# Altium footprint library swatpcblib.PcbLib: 202 footprints (part 5 of 13)
Each footprint in its own frame and in the unit in brackets; x right, y up, seen from the top. Pads: shape width x height; smd on the part's side, far side on the other; paste and mask are expansions set on the pad; w line width, h text height; cw(c..) or ccw(c..) is an arc to the next point about the centre after c.
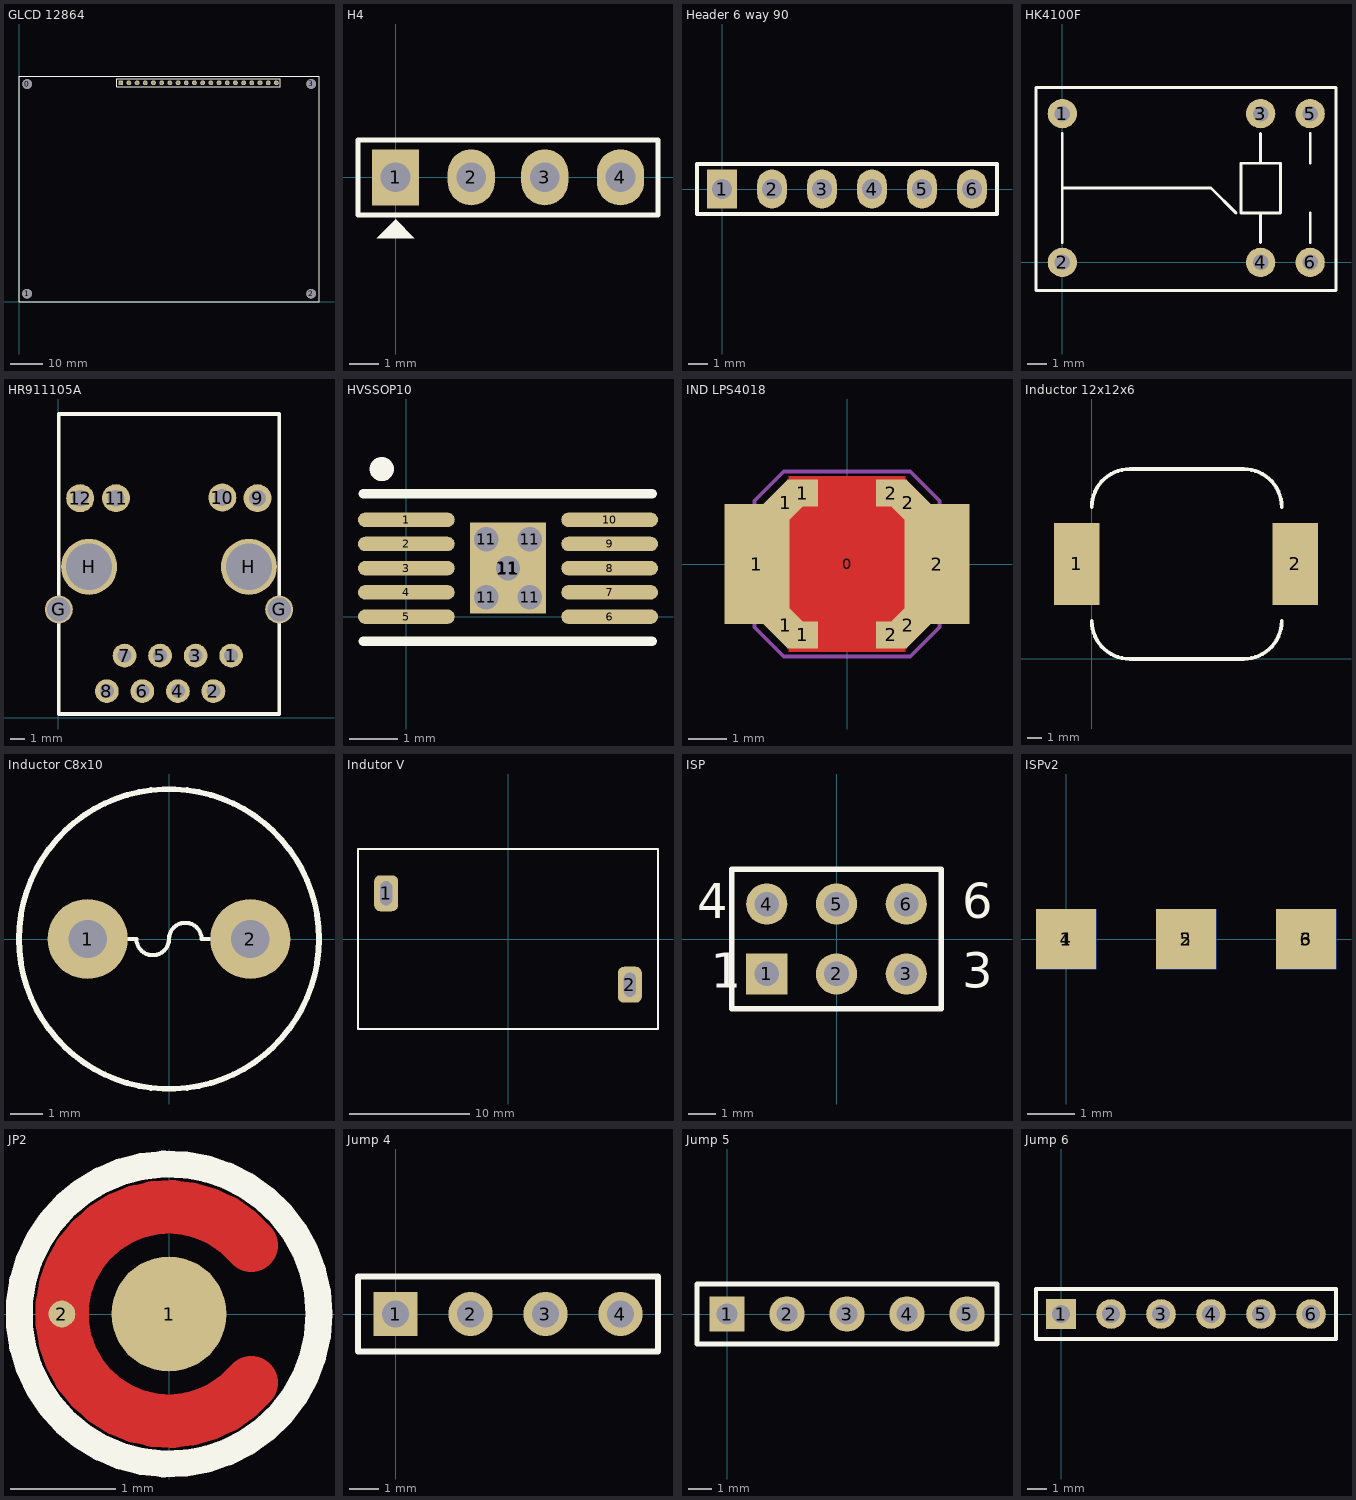
[diagram p4: the footprints below, top view; thin cyan lines are the x and y axes]

## GLCD 12864 [mm]
pads (24):
  round 3 hole 3: 0(2.54,67.488) 1(2.5,2.5) 2(90.551,2.489) 3(90.551,67.513)
  rect 1.5x1.5 hole 0.9: 1(31.521,67.869)
  round 1.5 hole 0.9: 2(34.061,67.869) 3(36.601,67.869) 4(39.141,67.869) 5(41.681,67.869) 6(44.221,67.869) 7(46.761,67.869) 8(49.301,67.869) 9(51.841,67.869) 10(54.381,67.869) 11(56.921,67.869) 12(59.461,67.869) 13(62.001,67.869) 14(64.541,67.869) 15(67.081,67.869) 16(69.621,67.869) 17(72.161,67.869) 18(74.701,67.869) 19(77.241,67.869) 20(79.781,67.869)
Top Overlay:
  lines w0.2: -0.003,-0.043 -0.003,69.957 92.989,69.957 92.989,-0.043 -0.003,-0.043 ; 30.251,66.599 81.051,66.599 81.051,69.139 32.156,69.139 30.251,69.139 30.251,66.599
3D body: height 1.5, standoff 0, extent 78.511,66.599 81.051,69.139
3D body: height 1.5, standoff 0, extent 68.351,66.573 70.891,69.113
3D body: height 1.5, standoff 0, extent 70.891,66.573 73.431,69.113
3D body: height 1.5, standoff 0, extent 73.431,66.573 75.971,69.113
3D body: height 1.5, standoff 0, extent 55.651,66.573 58.191,69.113
3D body: height 1.5, standoff 0, extent 58.191,66.573 60.731,69.113
3D body: height 1.5, standoff 0, extent 60.731,66.573 63.271,69.113
3D body: height 1.5, standoff 0, extent 63.271,66.573 65.811,69.113
3D body: height 1.5, standoff 0, extent 65.811,66.573 68.351,69.113
3D body: height 1.5, standoff 0, extent 42.951,66.573 45.491,69.113
3D body: height 1.5, standoff 0, extent 45.491,66.573 48.031,69.113
3D body: height 1.5, standoff 0, extent 48.031,66.573 50.571,69.113
3D body: height 1.5, standoff 0, extent 50.571,66.573 53.111,69.113
3D body: height 1.5, standoff 0, extent 53.111,66.573 55.651,69.113
3D body: height 1.5, standoff 0, extent 30.251,66.573 32.791,69.113
3D body: height 1.5, standoff 0, extent 32.791,66.573 35.331,69.113
3D body: height 1.5, standoff 0, extent 35.331,66.573 37.871,69.113
3D body: height 1.5, standoff 0, extent 37.871,66.573 40.411,69.113
3D body: height 1.5, standoff 0, extent 40.411,66.573 42.951,69.113
3D body: height 1.5, standoff 0, extent 75.971,66.573 78.511,69.113
3D body "User Library-QC12864B.step": height 9.5, standoff -8, extent 0.058,0.002 93.058,70.002

## H4 [mm]
pads (4):
  rect 1.6x1.9 hole 1: 1(0,0)
  oval 1.6x1.9 hole 1: 2(2.565,0) 3(5.055,0) 4(7.62,0)
Top Overlay:
  region: 0,-1.422 -0.635,-2.057 0.635,-2.057
  lines w0.178: -1.27,-1.27 -1.27,1.27 8.89,1.27 8.89,-1.27 -1.27,-1.27

## Header 6 way 90 [mm]
pads (6):
  rect 1.5x2 hole 1: 1(0,0)
  oval 1.5x2 hole 1: 2(2.54,0) 3(5.08,0) 4(7.62,0) 5(10.16,0) 6(12.7,0)
Top Overlay:
  lines w0.2: -1.27,-1.27 13.97,-1.27 13.97,1.27 -1.27,1.27 -1.27,-1.27
3D body "4234.stp": height 5.88, standoff -3.57, extent -1.117,-8.941 13.869,1.143

## HK4100F [mm] "Relay 6 pin"
pads (6):
  round 1.5 hole 0.8: 1(0,7.62) 2(0,0) 3(10.16,7.62) 4(10.16,0) 5(12.7,7.62) 6(12.7,0)
Top Overlay:
  lines w0.15: 0,1.016 0,6.604 ; 0,3.81 7.62,3.81 8.89,2.54 ; 10.16,1.016 10.16,2.54 ; 10.16,5.08 10.16,6.604 ; 12.7,1.016 12.7,2.54 ; 12.7,5.08 12.7,6.604 ; -1.346,-1.448 14.021,-1.448 14.021,8.966 -1.346,8.966 -1.346,-1.448 ; 9.144,2.54 9.144,5.08 11.176,5.08 11.176,2.54 9.144,2.54
3D body "User Library-HK4100F.step": height 11.82, standoff -2.74, extent -1.379,-1.434 14.021,8.966

## HR911105A [mm] "HanRun HR911105A"
pads (16):
  round 1.7 hole 1: 1(12.369,4.425) 2(11.099,1.885) 3(9.829,4.425) 4(8.559,1.885) 5(7.289,4.425) 6(6.019,1.885) 7(4.749,4.425) 8(3.479,1.885)
  round 2 hole 1.2: 9(14.249,15.675) 10(11.735,15.723) 11(4.139,15.675) 12(1.575,15.672)
  round 2 hole 1.7: G(0.049,7.725) G(15.799,7.725)
  round 4 hole 3.3: H(2.209,10.775) H(13.639,10.775)
Top Overlay:
  lines w0.254: 0.049,0.254 0.049,21.692 15.799,21.692 15.799,0.254 0.049,0.254
3D body "User Library-HR911105A.step": height 13.51, standoff -2.99, extent 0.051,0.292 15.931,21.692

## HVSSOP10 [mm] "TPS92512"
pads (16):
  oval 2x0.3 smd paste-0.102 mask+0.051: 1(0,2) 2(0,1.5) 3(0,1) 4(0,0.5) 5(0,0) 6(4.2,0) 7(4.2,0.5) 8(4.2,1) 9(4.2,1.5) 10(4.2,2)
  round 0.5 hole 0.5 mask+0.051: 11(1.65,0.4) 11(1.65,1.6) 11(2.1,1) 11(2.55,0.4) 11(2.55,1.6)
  rect 1.57x1.88 smd paste-0.102 mask+0.051: 11(2.1,1)
Top Overlay:
  circle w0.25: c-0.508,3.048 r0.125
  lines w0.2: -0.889,-0.508 5.08,-0.508 ; -0.889,2.54 5.08,2.54
3D body: height 1.5, standoff 0, extent 1.143,-0.254 3.048,2.286

## IND LPS4018 [mm] "Shielded Power Inductor, Body 4.0x4.0x1.8mm"
pads (11):
  round 0.5 on Mech14: 0(0,0)
  rrect1% 1.7x3.124 smd: 1(-2.35,0) 2(2.35,0)
  rrect1% 0.786x0.902 smd rot 45: 1(-1.603,-1.603) 2(1.603,1.603)
  rrect1% 0.786x0.902 smd rot 135: 1(-1.603,1.603) 2(1.603,-1.603)
  rrect1% 0.812x0.7 smd: 1(-1.156,-1.85) 1(-1.156,1.85) 2(1.156,-1.85) 2(1.156,1.85)
Top Layer:
  pour cut-out: -1.524,2.286 1.524,2.286 1.524,-2.286 -1.524,-2.286
Mechanical 13:
  lines w0.076: -2,-1.275 -2,1.325 -1.325,2 1.325,2 2,1.325 2,-1.275 1.275,-2 -1.275,-2 -2,-1.275
Mechanical 14:
  lines w0.1: -2.413,-1.651 -1.651,-2.413 1.651,-2.413 2.413,-1.651 2.413,1.651 1.651,2.413 -1.651,2.413 -2.413,1.651 -2.413,-1.651
3D body "Inductor Coilcraft LPS4018.STEP": height 1.79, standoff -0.01, extent -2,-2 2,2

## Inductor 12x12x6 [mil]
height 255
pads (2):
  rect 120x215 smd: 1(-39.37,250) 2(535.43,250)
Top Overlay:
  lines w10: 0,100 ccw(c100,100) 100,0 400,0 ccw(c400,100) 500,100 ; 0,400 cw(c100,400) 100,500 400,500 cw(c400,400) 500,400
3D body "Coilcraft-MSS1583.STEP": height 356.3, standoff 0, extent -50,-47.24 544.49,547.24

## Inductor C8x10 [mm]
pads (2):
  round 2.5 hole 1.2: 1(-2.54,0) 2(2.54,0)
Top Overlay:
  circle w0.178: c0,0 r4.684
  lines w0.127: -1.27,0 -1.016,0 ccw(c-0.508,0) 0,0 cw(c0.508,0) 1.016,0 1.27,0
3D body "Inductor 10x12 (200 mils).STEP": height 12.02, standoff -3.98, extent -5,-5.035 5,4.965

## Indutor V [mm]
pads (2):
  rrect50% 2x3 hole 1 slot 2 at 90 deg: 1(-10.16,3.81) 2(10.16,-3.81)
Top Overlay:
  lines w0.15: -12.5,-7.5 -12.5,7.5 12.5,7.5 12.5,-7.5 -12.5,-7.5
3D body "User Library-INDUCTOR - 2100HT series.STEP": height 21.92, standoff 0.08, extent -11.684,-5.207 10.16,18.923

## ISP [mm]
pads (6):
  rect 1.5x1.5 hole 0.9: 1(-2.54,-1.27)
  round 1.5 hole 0.9: 2(0,-1.27) 3(2.54,-1.27) 4(-2.54,1.27) 5(0,1.27) 6(2.54,1.27)
Top Overlay:
  lines w0.2: -3.81,-2.54 -3.81,2.54 3.81,2.54 3.81,-2.54 -3.81,-2.54
  text "4" at -5.08,0.762 h1.27
  text "1" at -4.572,-1.778 h1.27
  text "3" at 4.572,-1.778 h1.27
  text "6" at 4.572,0.762 h1.27
3D body: height 1.5, standoff 0, extent -3.81,0 -1.27,2.54
3D body: height 1.5, standoff 0, extent -1.27,0 1.27,2.54
3D body: height 1.5, standoff 0, extent 1.27,0 3.81,2.54
3D body: height 1.5, standoff 0, extent 1.27,-2.54 3.81,0
3D body: height 1.5, standoff 0, extent -1.27,-2.54 1.27,0
3D body: height 1.5, standoff 0, extent -3.81,-2.54 -1.27,0
3D body: height 7, standoff -1, extent -2.932,0.864 -2.134,1.66
3D body: height 7, standoff -1, extent -2.932,-1.676 -2.134,-0.88
3D body: height 7, standoff -1, extent -0.392,0.864 0.406,1.66
3D body: height 7, standoff -1, extent -0.392,-1.676 0.406,-0.88
3D body: height 7, standoff -1, extent 2.148,0.864 2.946,1.66
3D body: height 7, standoff -1, extent 2.148,-1.676 2.946,-0.88

## ISPv2 [mm]
pads (6):
  rect 1.27x1.27 smd: 1(0,0) 2(2.54,0) 3(5.08,0)
  rect 1.27x1.27 smd far side: 4(0,0) 5(2.54,0) 6(5.08,0)

## JP2 [mil]
pads (2):
  round 43 smd: 1(0,0)
  round 10 smd: 2(-40,0)
Top Layer:
  lines w20: 30.64,-25.71 cw(c0,0) 30.64,25.71
Top Overlay:
  circle w10: c0,0 r56.04
Top Solder:
  lines w25: 30.64,-25.71 cw(c0,0) 30.64,25.71

## Jump 4 [mm]
pads (4):
  rect 1.5x1.5 hole 0.9: 1(0,0)
  round 1.5 hole 0.9: 2(2.54,0) 3(5.08,0) 4(7.62,0)
Top Overlay:
  lines w0.2: -1.27,-1.27 8.89,-1.27 8.89,1.27 -1.27,1.27 -1.27,-1.27
3D body: height 1.5, standoff 0, extent 6.35,-1.27 8.89,1.27
3D body: height 7, standoff -1, extent 7.214,-0.406 8.01,0.392
3D body: height 1.5, standoff 0, extent 3.81,-1.27 6.35,1.27
3D body: height 7, standoff -1, extent 4.674,-0.406 5.47,0.392
3D body: height 1.5, standoff 0, extent 1.27,-1.27 3.81,1.27
3D body: height 7, standoff -1, extent 2.134,-0.406 2.93,0.392
3D body: height 1.5, standoff 0, extent -1.27,-1.27 1.27,1.27
3D body: height 7, standoff -1, extent -0.406,-0.406 0.39,0.392

## Jump 5 [mm]
pads (5):
  rect 1.5x1.5 hole 0.9: 1(0,0)
  round 1.5 hole 0.9: 2(2.54,0) 3(5.08,0) 4(7.62,0) 5(10.16,0)
Top Overlay:
  lines w0.2: -1.27,-1.27 11.43,-1.27 11.43,1.27 -1.27,1.27 -1.27,-1.27
3D body: height 1.5, standoff 0, extent 8.89,-1.27 11.43,1.27
3D body: height 7, standoff -1, extent 9.754,-0.406 10.55,0.392
3D body: height 1.5, standoff 0, extent 6.35,-1.27 8.89,1.27
3D body: height 7, standoff -1, extent 7.214,-0.406 8.01,0.392
3D body: height 1.5, standoff 0, extent 3.81,-1.27 6.35,1.27
3D body: height 7, standoff -1, extent 4.674,-0.406 5.47,0.392
3D body: height 1.5, standoff 0, extent 1.27,-1.27 3.81,1.27
3D body: height 7, standoff -1, extent 2.134,-0.406 2.93,0.392
3D body: height 1.5, standoff 0, extent -1.27,-1.27 1.27,1.27
3D body: height 7, standoff -1, extent -0.406,-0.406 0.39,0.392

## Jump 6 [mm]
pads (6):
  rect 1.5x1.5 hole 0.9: 1(0,0)
  round 1.5 hole 0.9: 2(2.54,0) 3(5.08,0) 4(7.62,0) 5(10.16,0) 6(12.7,0)
Top Overlay:
  lines w0.2: -1.27,-1.27 13.97,-1.27 13.97,1.27 -1.27,1.27 -1.27,-1.27
3D body: height 7, standoff -1, extent 12.294,-0.406 13.09,0.392
3D body: height 1.5, standoff 0, extent 11.43,-1.27 13.97,1.27
3D body: height 7, standoff -1, extent -0.406,-0.406 0.39,0.392
3D body: height 1.5, standoff 0, extent -1.27,-1.27 1.27,1.27
3D body: height 7, standoff -1, extent 2.134,-0.406 2.93,0.392
3D body: height 1.5, standoff 0, extent 1.27,-1.27 3.81,1.27
3D body: height 7, standoff -1, extent 4.674,-0.406 5.47,0.392
3D body: height 1.5, standoff 0, extent 3.81,-1.27 6.35,1.27
3D body: height 7, standoff -1, extent 7.214,-0.406 8.01,0.392
3D body: height 1.5, standoff 0, extent 6.35,-1.27 8.89,1.27
3D body: height 7, standoff -1, extent 9.754,-0.406 10.55,0.392
3D body: height 1.5, standoff 0, extent 8.89,-1.27 11.43,1.27